# Altium footprint library 20210518.PcbLib: 414 footprints (part 18 of 26)
Each footprint in its own frame and in the unit in brackets; x right, y up, seen from the top. Pads: shape width x height; smd on the part's side, far side on the other; paste and mask are expansions set on the pad; w line width, h text height; cw(c..) or ccw(c..) is an arc to the next point about the centre after c.
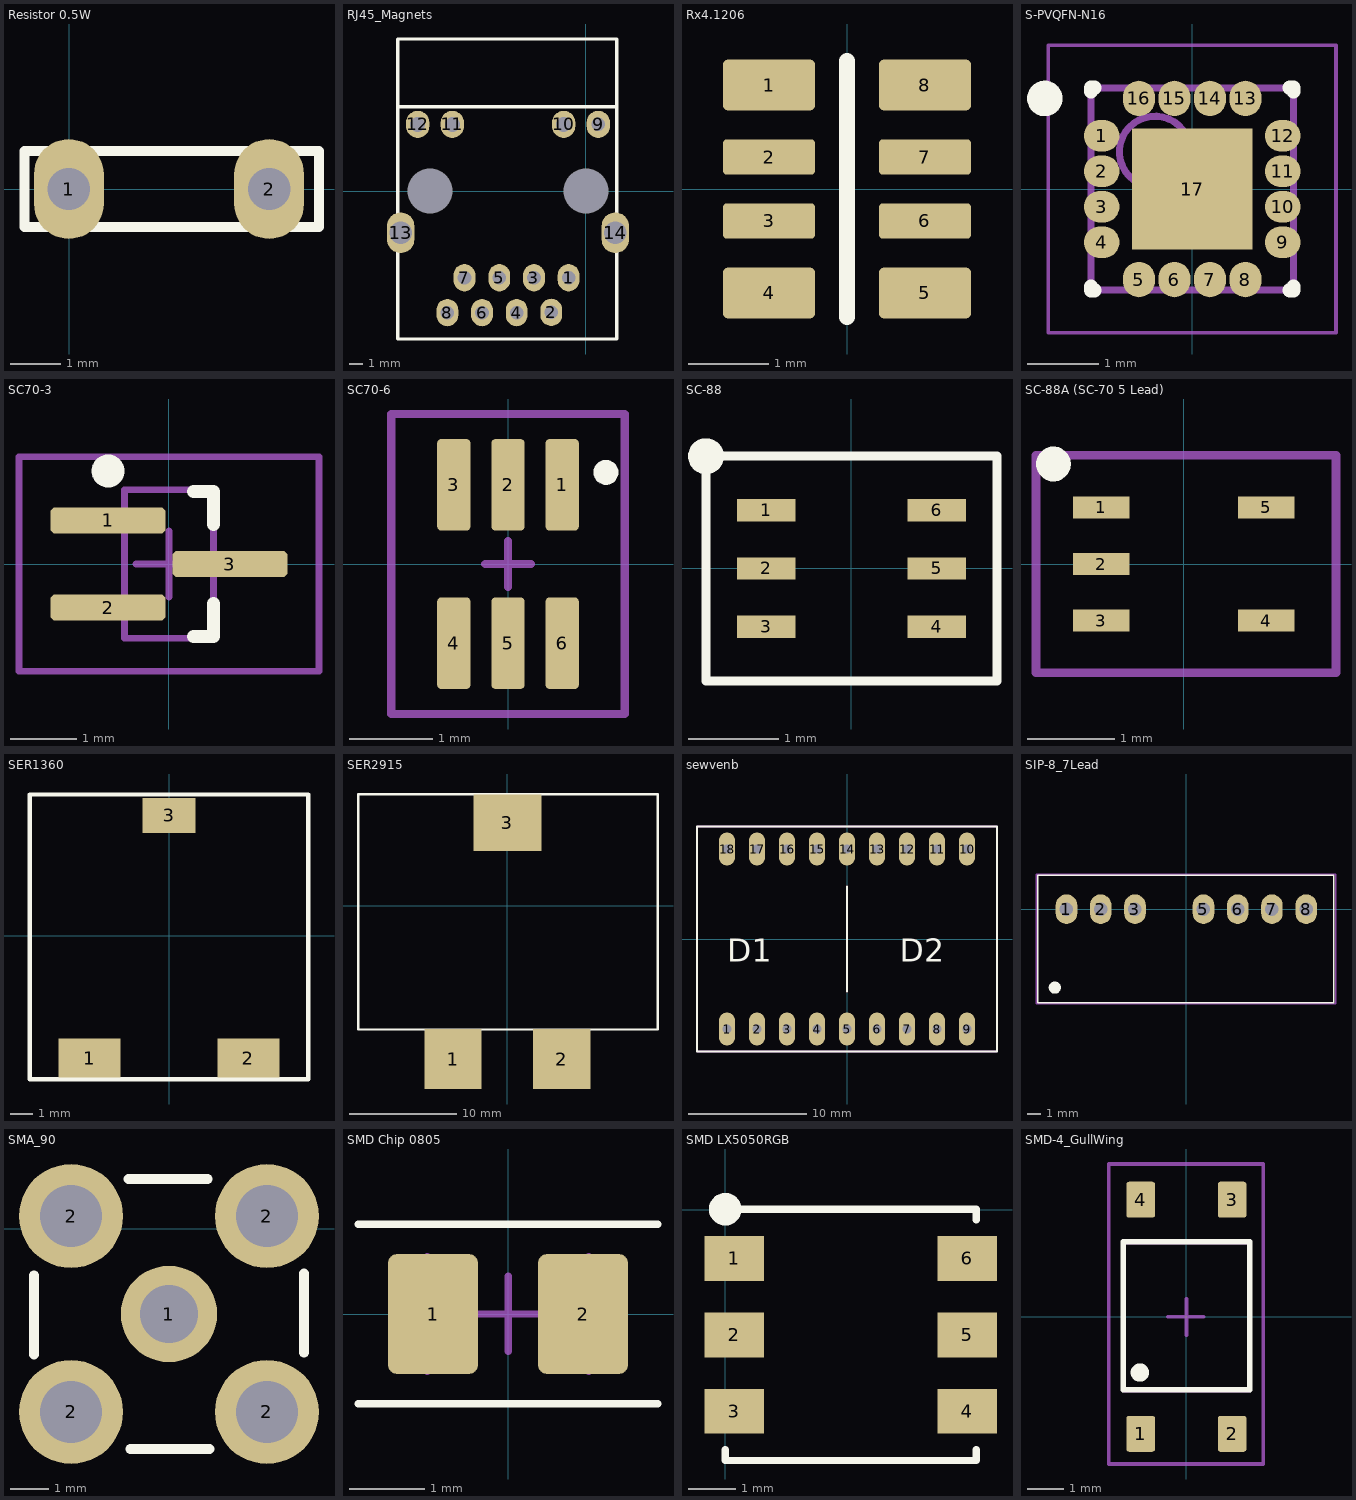
[diagram p17: the footprints below, top view; thin cyan lines are the x and y axes]

## Resistor 0.5W [mm] "Metal Film Resistor"
height 1.524
pads (2):
  oval 1.4x2 hole 0.85: 1(-0.01,0) 2(4,0)
Top Overlay:
  lines w0.2: 5,0.74 5,-0.762 -0.9,-0.762 -0.9,0.762 5,0.762
3D body: height 12.39, standoff -5.3, extent -1.713,-1.691 4.384,1.691

## RJ45_Magnets [mm] "Chip Resistor, Body 3.1x1.6mm, IPC High Density"
height 0.55
pads (16):
  round 0 hole 3.3: 0(-11.43,0) 0(0,0)
  oval 1.6x2 hole 1: 1(-1.27,-6.35) 2(-2.54,-8.89) 3(-3.81,-6.35) 4(-5.08,-8.91) 5(-6.35,-6.35) 6(-7.62,-8.91) 7(-8.91,-6.35) 8(-10.16,-8.91)
  oval 1.7x2 hole 1: 9(0.91,4.9)
  oval 1.7x2 hole 1.1: 10(-1.63,4.9) 11(-9.8,4.9) 12(-12.34,4.9)
  oval 2x3 hole 1.65: 13(-13.59,-3.05) 14(2.16,-3.05)
Top Overlay:
  lines w0.254: -13.8,6.2 2.2,6.2 ; -13.81,-10.845 -13.81,11.165 2.27,11.165 2.27,-10.845 -13.81,-10.845
3D body: height 2.5, standoff -14, extent -13.635,-10.485 2.245,10.915

## Rx4.1206 [mm] "4xChip Resistor, Body 1.6x0.8mm, IPC High Density"
height 0.45
pads (8):
  rrect20% 1.15x0.64 smd: 1(-0.975,1.3) 4(-0.975,-1.3) 5(0.975,-1.3) 8(0.975,1.3)
  rrect20% 1.15x0.44 smd: 2(-0.975,0.4) 3(-0.975,-0.4) 6(0.975,-0.4) 7(0.975,0.4)
Top Overlay:
  lines w0.2: 0,-1.6 0,1.6
3D body: height 0.55, standoff 0, extent -0.8,-1.6 0.8,1.6

## S-PVQFN-N16 [mm] "PQFN, 16-Leads, Body 3,00x3,00mm, Pitch 0,50mm, Thermal Pad 1,70x1,70mm, IPC Low Density"
height 1
pads (17):
  oval 0.5x0.45 smd: 1(-1.275,0.75) 2(-1.275,0.25) 3(-1.275,-0.25) 4(-1.275,-0.75) 9(1.275,-0.75) 10(1.275,-0.25) 11(1.275,0.25) 12(1.275,0.75)
  oval 0.45x0.5 smd: 5(-0.75,-1.275) 6(-0.25,-1.275) 7(0.25,-1.275) 8(0.75,-1.275) 13(0.75,1.275) 14(0.25,1.275) 15(-0.25,1.275) 16(-0.75,1.275)
  rect 1.7x1.7 smd: 17(0,0)
Top Overlay:
  circle w0.25: c-2.075,1.275 r0.125
  lines w0.2: -1.425,-1.375 -1.425,-1.425 -1.375,-1.425 ; -1.425,1.375 -1.425,1.425 -1.375,1.425 ; 1.375,-1.425 1.425,-1.425 1.425,-1.375 ; 1.375,1.425 1.425,1.425 1.425,1.375
Mechanical 13:
  circle w0.1: c-0.525,0.525 r0.5
  lines w0.1: -1.425,-1.425 1.425,-1.425 1.425,1.425 -1.425,1.425 -1.425,-1.425
Mechanical 15:
  lines w0.05: -2.025,-2.025 2.025,-2.025 2.025,2.025 -2.025,2.025 -2.025,-2.025
  lines w0.1: -0.5,0 0.5,0 ; 0,-0.5 0,0.5
3D body: height 1, standoff 0.2, extent -1.425,-1.425 1.425,1.425

## SC70-3 [mm] "SC70-3, 3-Leads, Body 2,3x2,4mm (max), Pitch 0,66mm, IPC Low Density"
height 1.1
pads (3):
  rrect40% 1.75x0.4 smd: 1(-0.925,0.66) 2(-0.925,-0.66) 3(0.925,0)
Top Overlay:
  circle w0.25: c-0.925,1.41 r0.125
  lines w0.2: 0.375,-1.1 0.675,-1.1 0.675,-0.6 ; 0.375,1.1 0.675,1.1 0.675,0.6
Mechanical 13:
  lines w0.1: -0.675,-1.125 -0.675,1.125 0.675,1.125 0.675,-1.125 -0.675,-1.125
Mechanical 15:
  lines w0.1: -0.5,0 0.5,0 ; 0,-0.5 0,0.5 ; -2.275,-1.625 -2.275,1.625 2.275,1.625 2.275,-1.625 -2.275,-1.625
3D body: height 1, standoff 0, extent -1.15,-1.05 1.15,1.05

## SC70-6 [mm]
height 1
pads (6):
  rrect25% 0.4x1.1 smd mask+0.076: 1(0.65,0.95) 2(0,0.95) 3(-0.65,0.95) 4(-0.65,-0.95) 5(0,-0.95) 6(0.65,-0.95)
Top Overlay:
  circle w0.15: c1.175,1.1 r0.075
Mechanical 15:
  lines w0.1: -0.275,0 0.275,0 ; 0,-0.275 0,0.275 ; -1.4,-1.8 -1.4,1.8 1.4,1.8 1.4,-1.8 -1.4,-1.8
3D body: height 1.1, standoff 0, extent -1.1,-1.2 1.1,1.2

## SC-88 [mm] "SC-88"
height 0.88
pads (6):
  rect 0.65x0.25 smd: 1(-0.95,0.65) 2(-0.95,0) 3(-0.95,-0.65) 4(0.95,-0.65) 5(0.95,0) 6(0.95,0.65)
Top Overlay:
  circle w0.2: c-1.62,1.25 r0.1
  lines w0.1: -1.62,-1.25 1.62,-1.25 1.62,1.25 -1.62,1.25 -1.62,-1.25
3D body: height 0.95, standoff 0, extent -1.01,-1.04 1.09,1.11

## SC-88A (SC-70 5 Lead) [mm] "SC-88A (SC-70 5 Lead), 1.25x2"
height 0.88
pads (5):
  rect 0.65x0.25 smd: 1(-0.95,0.65) 2(-0.95,0) 3(-0.95,-0.65) 4(0.95,-0.65) 5(0.95,0.65)
Top Overlay:
  circle w0.2: c-1.5,1.15 r0.1
Mechanical 15:
  lines w0.1: -1.7,-1.25 -1.7,1.25 1.75,1.25 1.75,-1.25 -1.7,-1.25
3D body: height 0.95, standoff 0, extent -1.05,-1 1.05,1

## SER1360 [mm] "Coilcraft"
height 6
pads (3):
  rect 2.8x1.78 smd: 1(-3.6,-5.54) 2(3.6,-5.54)
  rect 2.4x1.6 smd: 3(0,5.45)
Top Overlay:
  lines w0.2: -6.3,-6.5 -6.3,6.4 6.3,6.4 6.3,-6.5 -6.3,-6.5
3D body: height 5.75, standoff -0.05, extent -6.45,-6.6 6.45,6.4

## SER2915 [mm]
pads (3):
  rect 5.33x5.59 smd: 1(-5.075,-14.355) 2(5.075,-14.355)
  rect 6.35x5.28 smd: 3(0,7.72)
Top Overlay:
  lines w0.2: -13.95,-11.56 -13.95,10.4 14,10.4 ; -13.9,-11.6 14,-11.6 ; 14.05,-11.56 14.05,10.4
3D body: height 14.3, standoff -1.06, extent -13.8,-17.37 14.102,10.571

## sewvenb [mil]
pads (18):
  oval 54x110 hole 31: 1(-400,-300) 2(-300,-300) 3(-200,-300) 4(-100,-300) 5(0,-300) 6(100,-300) 7(200,-300) 8(300,-300) 9(400,-300) 10(400,300) 11(300,300) 12(200,300) 13(100,300) 14(0,300) 15(-100,300) 16(-200,300) 17(-300,300) 18(-400,300)
Top Overlay:
  lines w8: 0,-175 0,175 ; -500,-375 -500,375 500,375 500,-375 -500,-375
  text "D2" at 175,-100 h131.25
  text "D1" at -400,-100 h131.25
Bottom Overlay:
  lines w8: 0,-175 0,175 ; -500,-375 -500,375 500,375 500,-375 -500,-375
  text "d" at 112.48,-225 h56.25
  text "dp" at 462.48,-225 h56.25
  text "c" at 312.48,-225 h56.25
  text "g" at 212.48,-225 h56.25
  text "D1" at -214.73,-100 h131.25
  text "D2" at 379.72,-100 h131.25
  text "f" at -370.83,150 h56.25
  text "g" at -287.52,150 h56.25
  text "a" at -183.35,150 h56.25
  text "b" at -87.52,150 h56.25
  text "+" at -52.53,176.67 h56.25
  text "+" at 47.47,176.67 h56.25
  text "f" at 208.32,150 h56.25
  text "a" at 316.65,150 h56.25
  text "b" at 412.48,150 h56.25
  text "e" at -383.35,-225 h56.25
  text "d" at -287.52,-225 h56.25
  text "c" at -187.52,-225 h56.25
  text "dp" at -62.52,-225 h56.25
  text "e" at 16.73,-233.27 h56.25
Mechanical 13:
  lines w8: -500,-375 500,-375 500,375 -500,375 -500,-375
Mechanical 15:
  lines w3.94: -499.02,-364.17 -499.02,374.02 500,374.02 500,-374.02 -499.02,-374.02 -499.02,-359.25
3D body: height 314.96, standoff 0, extent -492.13,-374.02 492.13,374.02

## SIP-8_7Lead [mm] "Murata NCS3 Series DC/DC Converter Footprint"
height 11.25
pads (7):
  oval 1.6x2.2 hole 1: 1(-8.89,0) 2(-6.35,0) 3(-3.81,0) 5(1.27,0) 6(3.81,0) 7(6.35,0) 8(8.89,0)
Top Overlay:
  circle w0.25: c-9.754,-5.842 r0.13
  circle w0.25: c-9.754,-5.817 r0.33
  lines w0.1: -11.025,-6.95 10.925,-6.95 10.925,2.5 -11.025,2.5 -11.025,-6.95
Mechanical 15:
  lines w0.1: -11.151,-7.011 -11.151,2.59 11.1,2.59 11.1,-7.011 -11.151,-7.011
3D body: height 11.5, standoff -4.6, extent -11,-7.011 11,2.489

## SMA_90 [mm] "90 Degree SMA Connector"
pads (5):
  round 2.5 hole 1.5: 1(5.253,-2.211)
  round 2.7 hole 1.6: 2(2.713,-4.751) 2(2.713,0.329) 2(7.793,-4.751) 2(7.793,0.329)
Top Overlay:
  lines w0.254: 1.753,-3.265 1.753,-1.204 ; 4.199,1.289 6.26,1.289 ; 4.245,-5.711 6.306,-5.711 ; 8.753,-3.219 8.753,-1.158
3D body: height 10.15, standoff -3.35, extent 2.083,-5.407 8.433,10.143

## SMD Chip 0805 [mm] "Custom 0805 Package"
height 0.55
pads (2):
  rrect20% 1.2x1.6 smd: 1(-1,0) 2(1,0)
Top Overlay:
  lines w0.1: -2,-1.2 2,-1.2 ; -2,1.2 2,1.2
Mechanical 13:
  lines w0.1: -1.075,-0.762 -1.075,0.762 ; 1.075,-0.762 1.075,0.762
Mechanical 15:
  lines w0.1: -1.4,-0.75 -1.4,0.75 ; -0.5,0 0.5,0 ; 0,-0.5 0,0.5 ; 1.4,-0.75 1.4,0.75
3D body: height 0.79, standoff 0, extent -1.254,-0.622 1.254,0.622

## SMD LX5050RGB [mil]
pads (6):
  rect 49x37 smd: 1(7.5,-40) 2(7.5,-103) 3(7.5,-166) 4(199.5,-166) 5(199.5,-103) 6(199.5,-40)
Top Overlay:
  circle w11.81: c0,0.5 r7.5
  lines w6: 0,-197.6 0,-206.5 207,-206.5 207,-197.6 ; 0,-8.4 0,0.5 207,0.5 207,-8.4
3D body: height 55.12, standoff -5.91, extent -3.27,-203.43 213.27,-6.58

## SMD-4_GullWing [mm]
height 1.6
pads (4):
  rrect20% 0.8x1 smd: 1(-1.27,-3.25) 2(1.27,-3.25) 3(1.27,3.25) 4(-1.27,3.25)
Top Overlay:
  circle w0.25: c-1.295,-1.549 r0.13
  lines w0.15: -1.753,-2.032 1.753,-2.032 1.753,2.083 -1.753,2.083 -1.753,-2.032
Mechanical 13:
  lines w0.1: -1.753,-2.057 1.753,-2.057 1.753,2.057 -1.753,2.057 -1.753,-2.057
Mechanical 15:
  lines w0.1: -0.517,0 0.483,0 ; 0,-0.508 0,0.492 ; -2.159,-4.089 -2.159,4.242 2.134,4.242 2.134,-4.089 -2.159,-4.089
3D body: height 1.98, standoff -0.1, extent -1.825,-3.525 1.775,3.475